# Altium footprint library mobinbyn-Connector.PcbLib: 82 footprints (part 6 of 6)
Each footprint in its own frame and in the unit in brackets; x right, y up, seen from the top. Pads: shape width x height; smd on the part's side, far side on the other; paste and mask are expansions set on the pad; w line width, h text height; cw(c..) or ccw(c..) is an arc to the next point about the centre after c.
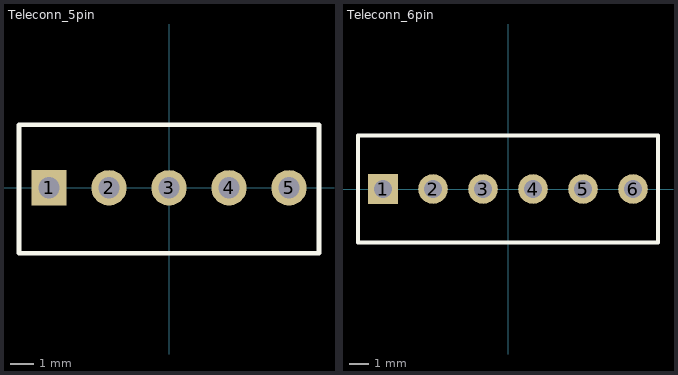
[diagram p5: the footprints below, top view; thin cyan lines are the x and y axes]

## Teleconn_5pin [mm]
pads (5):
  rect 1.5x1.5 hole 0.9: 1(-5.08,0)
  round 1.5 hole 0.9: 2(-2.54,0) 3(0,0) 4(2.54,0) 5(5.08,0)
Top Overlay:
  lines w0.2: -6.35,-2.775 -6.35,2.675 6.35,2.675 6.35,-2.775 -6.35,-2.775
3D body "5 Pin.STEP": height 11.7, standoff -3.54, extent -6.375,-2.971 6.325,2.871

## Teleconn_6pin [mm]
pads (6):
  rect 1.5x1.5 hole 0.9: 1(-6.35,0)
  round 1.5 hole 0.9: 2(-3.81,0) 3(-1.27,0) 4(1.27,0) 5(3.81,0) 6(6.35,0)
Top Overlay:
  lines w0.2: -7.62,-2.725 -7.62,2.725 7.62,2.725 7.62,-2.725 -7.62,-2.725
3D body "6 Pin.STEP": height 11.7, standoff -3.54, extent -7.62,-2.942 7.62,2.9